# Altium schematic symbol library lib_datalogger.SchLib: 1246 symbols (part 11 of 16) (continued)
## CMP-018-000050-1
designator R?, comment RES 124K OHM 1% 1/8W 0805 SMD  Case/Package: 0805  Voltage Rating: 150V  Packaging: Tape and Reel  Max Operating Temperature: 155°C  Manufacturer: Vishay  Resistance: 124kR  Composition: Thick Film  Min Operating Temperature: -55°C  Package Quantity: 10  Tolerance: 1%
RESISTOR, 0805, 124K, 1%, SMD; Manufacturer Part Number: CRCW0805124KFKEA; Temperature Coefficient: 100ppm/°C; Power Rating: 125mW; Voltage Rating (DC): 150V; ComponentLink9Description: https://datasheet.ciiva.com/2496/dcrcwe3-2496174.pdf?src-supplier=Digi-Key; ComponentLink8URL: https://datasheet.ciiva.com/2496/dcrcwe3-2496173.pdf?src-supplier=Digi-Key; Width: 1.25mm; RoHS: Yes; ComponentLink7Description: https://datasheet.ciiva.com/2496/dcrcwe3-2496172.pdf?src-supplier=Digi-Key; Radiation Hardening: No; Source: mits.SchLib; ComponentLink4URL: https://datasheet.ciiva.com/3258/dcrcwe3-3258075.pdf?src-supplier=Avnet; Termination: SMD/SMT; ComponentLink5Description: https://datasheet.ciiva.com/5551/dcrcwe3-109170-5551131.pdf?src-supplier=Mouser; ComponentLink1Description: https://datasheet.ciiva.com/7714/1697337-7714262.pdf?src-supplier=Element14; Contact Plating: Tin; REACH SVHC: Unknown; Stock 1: 15950; ComponentLink8Description: https://datasheet.ciiva.com/2496/dcrcwe3-2496173.pdf?src-supplier=Digi-Key; Number of Pins: 2; Design Item ID: RES 124K OHM 1% 1/8W 0805 SMD; Features: Automotive AEC-Q200; Case Code (Metric): 2012; ComponentLink7URL: https://datasheet.ciiva.com/2496/dcrcwe3-2496172.pdf?src-supplier=Digi-Key; ComponentLink6Description: https://datasheet.ciiva.com/8974/dcrcwe3-8974027.pdf?src-supplier=Avnet; Depth: 1.25mm; ComponentLink2URL: https://datasheet.ciiva.com/7714/1697337-7714263.pdf?src-supplier=Element14; ComponentLink2Description: https://datasheet.ciiva.com/7714/1697337-7714263.pdf?src-supplier=Element14; Case Code (Imperial): 0805; Pricing 1: 1=0,10000, 10=0,06200, 100=0,02540, 1000=0,01142, 2500=0,00991 (USD); Lead Free: Lead Free; ComponentLink3URL: https://datasheet.ciiva.com/7725/125364-7725784.pdf?src-supplier=Element14; Height: 0.02inch; ComponentLink5URL: https://datasheet.ciiva.com/5551/dcrcwe3-109170-5551131.pdf?src-supplier=Mouser; ComponentLink4Description: https://datasheet.ciiva.com/3258/dcrcwe3-3258075.pdf?src-supplier=Avnet; Military Standard: Not; ComponentLink9URL: https://datasheet.ciiva.com/2496/dcrcwe3-2496174.pdf?src-supplier=Digi-Key; ComponentLink3Description: https://datasheet.ciiva.com/7725/125364-7725784.pdf?src-supplier=Element14; Weight: 0.000194oz; Number of Terminations: 2; Max Power Dissipation: 125mW; Length: 2mm; ComponentLink1URL: https://datasheet.ciiva.com/7714/1697337-7714262.pdf?src-supplier=Element14; ComponentLink6URL: https://datasheet.ciiva.com/8974/dcrcwe3-8974027.pdf?src-supplier=Avnet; Category: Chip SMD Resistors
footprint CR1608-0603 (Chip Resistor; Body 1.6 x 0.8 mm (LxW typ))
footprint CR2012-0805 (Chip Capacitor)
pins: 1, 2

## CMP-018-000051-1
designator R?, comment RES 12K4 OHM 1% 1/8W 0805 SMD  Packaging: Cut Tape (CT)  Composition: Thick Film  Tolerance: ±1%  Manufacturer: Panasonic Electronic Components
RES SMD 12.4K OHM 1% 1/8W 0805; Manufacturer Part Number: ERJ-6ENF1242V; Temperature Coefficient: ±100ppm/°C; Power (Watts): 0.125W, 1/8W; Resistance (Ohms): 12.4k; Package / Case: 0805 (2012 Metric); RoHS: RoHS Compliant; Supplier Device Package: 0805; Size / Dimension: 0.079" L x 0.049" W (2.00mm x 1.25mm); Design Item ID: RES 12K4 OHM 1% 1/8W 0805 SMD; Stock 1: 55334; Operating Temperature: -55°C ~ 155°C; Category: Resistors; Features: Automotive AEC-Q200; ComponentLink1Description: http://industrial.panasonic.com/www-cgi/jvcr13pz.cgi?E+PZ+3+AOA0002+ERJ6ENF1242V+7+WW; Pricing 1: 1=0.1, 50=0.022, 100=0.0162, 250=0.01236, 500=0.0099, 1000=0.00729 (USD); Source: mits.SchLib; Number of Terminations: 2; ComponentLink1URL: http://industrial.panasonic.com/www-cgi/jvcr13pz.cgi?E+PZ+3+AOA0002+ERJ6ENF1242V+7+WW; Height: 0.028" (0.70mm)
footprint CR1608-0603 (Chip Resistor; Body 1.6 x 0.8 mm (LxW typ))
footprint CR2012-0805 (Chip Capacitor)
pins: 1, 2

## CMP-018-000052-1
designator R?, comment RES 147K OHM 1% 1/8W 0805 SMD  Package Quantity: 5000  Case/Package: 0805  Tolerance: 1%  Manufacturer: Panasonic  Packaging: Tape and Reel  Min Operating Temperature: -55°C  Composition: Thick Film  Resistance: 147kR  Voltage Rating: 150V  Max Operating Temperature: 155°C
RES SMD 147K OHM 1% 1/8W 0805; Manufacturer Part Number: ERJ-6ENF1473V; Max Power Dissipation: 125mW; Temperature Coefficient: 100ppm/°C; Depth: 1.25mm; Length: 2mm; ComponentLink3Description: https://datasheet.ciiva.com/22673/1678782-22673805.pdf?src-supplier=Element14; Design Item ID: RES 147K OHM 1% 1/8W 0805 SMD; Contact Plating: Tin; Voltage Rating (DC): 150V; ComponentLink1Description: https://datasheet.ciiva.com/17207/aoa0000ce2-17207528.pdf?src-supplier=Avnet+Europe; REACH SVHC: Yes; Height: 0.028inch; Military Standard: Not; RoHS: Yes; Lead Free: Lead Free; Pricing 1: 1=0,10000, 10=0,07200, 100=0,02750, 1000=0,01210, 2500=0,01045 (USD); ComponentLink2URL: https://datasheet.ciiva.com/22741/1678782-22741001.pdf?src-supplier=Element14; ComponentLink4Description: https://datasheet.ciiva.com/9185/aoa0000ce2-9185646.pdf?src-supplier=Avnet; Weight: 0.000194oz; Case Code (Metric): 2012; Width: 0.049inch; ComponentLink3URL: https://datasheet.ciiva.com/22673/1678782-22673805.pdf?src-supplier=Element14; ComponentLink5Description: https://datasheet.ciiva.com/24124/aoa0000ce2-24124558.pdf?src-supplier=Mouser; Radiation Hardening: No; Category: Chip SMD Resistors; Number of Terminations: 2; Case Code (Imperial): 0805; Power Rating: 125mW; ComponentLink2Description: https://datasheet.ciiva.com/22741/1678782-22741001.pdf?src-supplier=Element14; ComponentLink1URL: https://datasheet.ciiva.com/17207/aoa0000ce2-17207528.pdf?src-supplier=Avnet+Europe; Mount: Surface Mount; ComponentLink4URL: https://datasheet.ciiva.com/9185/aoa0000ce2-9185646.pdf?src-supplier=Avnet; ComponentLink5URL: https://datasheet.ciiva.com/24124/aoa0000ce2-24124558.pdf?src-supplier=Mouser; Source: mits.SchLib; Stock 1: 5141; Termination: SMD/SMT
footprint CR1608-0603 (Chip Resistor; Body 1.6 x 0.8 mm (LxW typ))
footprint CR2012-0805 (Chip Capacitor)
pins: 1, 2

## CMP-018-000053-1
designator R?, comment RES 1K2 OHM 1% 1/10W 0603 SMD  Manufacturer: Yageo  Composition: Thick Film  Packaging: Cut Tape (CT)  Tolerance: ±1%
RES SMD 1.2K OHM 1% 1/10W 0603; Manufacturer Part Number: RC0603FR-071K2L; Temperature Coefficient: ±100ppm/°C; Power (Watts): 0.1W, 1/10W; Size / Dimension: 0.063" L x 0.031" W (1.60mm x 0.80mm); Resistance (Ohms): 1.2k; Part Status: Active; Number of Terminations: 2; Pricing 1: 1=0.1, 10=0.014, 25=0.01, 100=0.0057, 250=0.00436, 500=0.00348, 1000=0.00257, 2500=0.00223 (USD); ComponentLink1Description: http://www.yageo.com/NewPortal/yageodocoutput?fileName=/pdf/R-Chip/PYu-RC_Group_51_RoHS_L_4.pdf; Failure Rate: -; Supplier Device Package: 0603; Stock 1: 636414; Operating Temperature: -55°C ~ 155°C; RoHS: RoHS Compliant; Package / Case: 0603 (1608 Metric); Features: Moisture Resistant; Design Item ID: RES 1K2 OHM 1% 1/10W 0603 SMD; Category: Resistors; ComponentLink1URL: http://www.yageo.com/NewPortal/yageodocoutput?fileName=/pdf/R-Chip/PYu-RC_Group_51_RoHS_L_4.pdf; Height - Seated (Max): 0.022" (0.55mm); Source: mits.SchLib
footprint CR1608-0603 (Chip Resistor; Body 1.6 x 0.8 mm (LxW typ))
footprint CR1608-0603 (Chip Resistor; Body 1.6 x 0.8 mm (LxW typ))
pins: 1, 2

## CMP-018-000054-1
designator R?, comment RES 1K69 OHM 1/8W 1% 0805 SMD  Composition: Thick Film  Manufacturer: Panasonic Electronic Components  Tolerance: ±1%  Packaging: Cut Tape (CT)
RES SMD 1.69K OHM 1% 1/8W 0805; Manufacturer Part Number: ERJ-6ENF1691V; Temperature Coefficient: ±100ppm/°C; eVendorPrice: 0,10; eVendor: Digi-Key; eVendor#: P1.69KCCT-ND; Power (Watts): 0.125W, 1/8W; MSRP: 0,00675; Resistance (Ohms): 1.69k; Pricing 1: 1=0.1, 50=0.022, 100=0.0162, 250=0.01236, 500=0.0099, 1000=0.00729 (USD); ComponentLink1URL: http://industrial.panasonic.com/www-cgi/jvcr13pz.cgi?E+PZ+3+AOA0002+ERJ6ENF1691V+7+WW; Source: mits.SchLib; Datasheet: http://industrial.panasonic.com/www-cgi/jvcr13pz.cgi?E+PZ+3+AOA0002+ERJ6ENF1691V+7+WW; Supplier Device Package: 0805; Operating Temperature: -55°C ~ 155°C; Stock 1: 32872; Height: 0.028" (0.70mm); ComponentLink1Description: http://industrial.panasonic.com/www-cgi/jvcr13pz.cgi?E+PZ+3+AOA0002+ERJ6ENF1691V+7+WW; Features: Automotive AEC-Q200; Size / Dimension: 0.079" L x 0.049" W (2.00mm x 1.25mm); Design Item ID: RES 1K69 OHM 1/8W 1% 0805 SMD; MOQ: 2500; Part#: ERJ-6ENF1691V; Number of Terminations: 2; Package / Case: 0805 (2012 Metric); Category: Resistors; RoHS: RoHS Compliant
footprint CR1608-0603 (Chip Resistor; Body 1.6 x 0.8 mm (LxW typ))
footprint CR2012-0805 (Chip Capacitor)
pins: 1, 2

## CMP-018-000055-1
designator R?, comment RES 1M OHM 0.5% 1/4W 0805 SMD  Manufacturer: Panasonic
Thick Film Resistors - SMD AEC-Q200; Manufacturer Part Number: ERJ-UP3D1004V; ComponentLink1URL: https://br.mouser.com/datasheet/2/315/Panasonic_Resistors_Thick_Film_Anti_Sulf_Anti_Surg-1825099.pdf; Design Item ID: RES 1M OHM 0.5% 1/4W 0805 SMD; Pricing 1: 1=0,48100, 25=0,40600, 50=0,28300, 100=0,15900, 250=0,13600, 500=0,11500 (USD); Source: mits.SchLib; Stock 1: 8579; RoHS: No; Category: Chip SMD Resistors; ComponentLink1Description: Datasheet
footprint CR1608-0603 (Chip Resistor; Body 1.6 x 0.8 mm (LxW typ))
footprint CR2012-0805 (Chip Capacitor)
pins: 1, 2

## CMP-018-000056-1
designator R?, comment RES 21K OHM 1/10W 1% 0603 SMD  Max Operating Temperature: 155°C  Packaging: Tape and Reel  Tolerance: 1%  Min Operating Temperature: -55°C  Manufacturer: Bourns  Resistance: 21kR  Package Quantity: 5000  Case/Package: 0603  Voltage Rating: 50V
21K Ohm 1% 0.1W(1/10W)  SMD; Manufacturer Part Number: CR0603-FX-2102ELF; Power Rating: 100mW; Temperature Coefficient: 100ppm/°C; ComponentLink2Description: https://datasheet.ciiva.com/14986/chpreztr-14986591.pdf?src-supplier=Digi-Key; ComponentLink2URL: https://datasheet.ciiva.com/14986/chpreztr-14986591.pdf?src-supplier=Digi-Key; Stock 1: 23550; Contact Plating: Tin; ComponentLink1Description: https://datasheet.ciiva.com/9121/chpreztr-9121901.pdf?src-supplier=Avnet; Number of Terminations: 2; Mount: Surface Mount; Design Item ID: RES 21K OHM 1/10W 1% 0603 SMD; ComponentLink1URL: https://datasheet.ciiva.com/9121/chpreztr-9121901.pdf?src-supplier=Avnet; Category: Chip SMD Resistors; Case Code (Metric): 1608; Resistor Type: Thick Film; Length: 1.6mm; RoHS: Yes; Series: CR0603; Max Power Dissipation: 100mW; Features: Moisture Resistant; Pricing 1: 50=0,00770, 500=0,00600, 1500=0,00580, 5000=0,00540, 25000=0,00520, 50000=0,00520, 50=0,00740, 500=0,00580, 1500=0,00550, 5000=0,00520, 25000=0,00500, 50000=0,00500, 50=0,03860, 500=0,03010, 1500=0,02880, 5000=0,02680, 25000=0,02620, 50000=0,02620, 50=0,03720, 500=0,02900, 1500=0,02770, 5000=0,02590, 25000=0,02520, 50000=0,02520, 50=0,00500, 500=0,00390, 1500=0,00370, 5000=0,00350, 25000=0,00340, 50000=0,00340, 50=0,00430, 500=0,00330, 1500=0,00320, 5000=0,00300, 25000=0,00290, 50000=0,00290, 50=0,04580, 500=0,03570, 1500=0,03420, 5000=0,03190, 25000=0,03110, 50000=0,03110, 50=0,64670, 500=0,50420, 1500=0,48230, 5000=0,44940, 25000=0,43850, 50000=0,43850, 50=0,02450, 500=0,01910, 1500=0,01820, 5000=0,01700, 25000=0,01660, 50000=0,01660, 50=0,44850, 500=0,34970, 1500=0,33450, 5000=0,31170, 25000=0,30410, 50000=0,30410, 50=0,05100, 500=0,03970, 1500=0,03800, 5000=0,03540, 25000=0,03460, 50000=0,03460, 50=0,00790, 500=0,00620, 1500=0,00590, 5000=0,00550, 25000=0,00540, 50000=0,00540, 50=0,00590, 500=0,00460, 1500=0,00440, 5000=0,00410, 25000=0,00400, 50000=0,00400 (AUD); Source: mits.SchLib; Termination: SMD/SMT; Width: 0.8mm; ComponentLink3Description: https://datasheet.ciiva.com/5586/chpreztr-5586573.pdf?src-supplier=Mouser; Case Code (Imperial): 0603; Radiation Hardening: No; Depth: 0.8mm; Military Standard: Not; Thickness: 457um; ComponentLink3URL: https://datasheet.ciiva.com/5586/chpreztr-5586573.pdf?src-supplier=Mouser; Construction: Rectangular; Height: 0.022inch
footprint CR1608-0603 (Chip Resistor; Body 1.6 x 0.8 mm (LxW typ))
footprint CR1608-0603 (Chip Resistor; Body 1.6 x 0.8 mm (LxW typ))
pins: 1, 2

## CMP-018-000057-1
designator R?, comment RES 220R OHM 5% 1/8W 0805 SMD  Packaging: Cut Tape (CT)  Composition: Thick Film  Manufacturer: Panasonic Electronic Components  Tolerance: ±5%
RES SMD 220 OHM 5% 1/8W 0805; Manufacturer Part Number: ERJ-6GEYJ221V; Resistance (Ohms): 220; Temperature Coefficient: ±200ppm/°C; Power (Watts): 0.125W, 1/8W; Manufacturer Part Number 2: 0805W8F2200T5E; Pricing 1: 1=0.1, 10=0.025, 25=0.018, 50=0.0136, 100=0.01, 250=0.00764, 500=0.00612, 1000=0.00451 (USD); Size / Dimension: 0.079" L x 0.049" W (2.00mm x 1.25mm); Pricing 2: 0.0034; ComponentLink1Description: http://industrial.panasonic.com/www-cgi/jvcr13pz.cgi?E+PZ+3+AOA0001+ERJ6GEYJ221V+7+WW; Category: Resistors; ComponentLink1URL: http://industrial.panasonic.com/www-cgi/jvcr13pz.cgi?E+PZ+3+AOA0001+ERJ6GEYJ221V+7+WW; Design Item ID: RES 220R OHM 5% 1/8W 0805 SMD; Failure Rate: -; Manufacturer 2: UNI-ROYAL(Uniroyal Elec); Source: mits.SchLib; RoHS: RoHS Compliant; Features: Automotive AEC-Q200; Part Status: Active; Supplier Device Package: 0805; Height - Seated (Max): 0.028" (0.70mm); Operating Temperature: -55°C ~ 155°C; Stock 1: 118007; Package / Case: 0805 (2012 Metric)
footprint CR1608-0603 (Chip Resistor; Body 1.6 x 0.8 mm (LxW typ))
footprint CR2012-0805 (Chip Capacitor)
pins: 1, 2

## CMP-018-000058-1
designator R?, comment RES 22K OHM 1% 1/10W 0603 SMD  Packaging: Cut Tape (CT)  Manufacturer: Yageo  Composition: Thick Film  Tolerance: ±1%
RES SMD 22K OHM 1% 1/10W 0603; Manufacturer Part Number: RC0603FR-0722KL; Power (Watts): 0.1W, 1/10W; Temperature Coefficient: ±100ppm/°C; ComponentLink1URL: http://www.yageo.com/documents/recent/PYu-RC_Group_51_RoHS_L_7.pdf; ComponentLink1Description: http://www.yageo.com/documents/recent/PYu-RC_Group_51_RoHS_L_7.pdf; Design Item ID: RES 22K OHM 1% 1/10W 0603 SMD; Part Status: Active; Failure Rate: -; Operating Temperature: -55°C ~ 155°C; Features: Moisture Resistant; Package / Case: 0603 (1608 Metric); Height - Seated (Max): 0.022" (0.55mm); Resistance (Ohms): 22k; Pricing 1: 1=0.1, 10=0.013, 25=0.0092, 50=0.007, 100=0.0052, 250=0.00396, 500=0.00316, 1000=0.00233 (USD); Category: Resistors; Size / Dimension: 0.063" L x 0.031" W (1.60mm x 0.80mm); Stock 1: 1971619; Supplier Device Package: 0603; Source: mits.SchLib; RoHS: RoHS Compliant
footprint CR1608-0603 (Chip Resistor; Body 1.6 x 0.8 mm (LxW typ))
footprint CR1608-0603 (Chip Resistor; Body 1.6 x 0.8 mm (LxW typ))
pins: 1, 2

## CMP-018-000059-1
designator R?, comment RES 249K OHM 1% 1/8W 0805 SMD  Package Quantity: 1  Resistance: 249kR  Tolerance: 0.1%  Manufacturer: Panasonic  Voltage Rating: 100V  Min Operating Temperature: -55°C  Composition: Thin Film,Metal Film  Packaging: Tape and Reel  Case/Package: 0805  Max Operating Temperature: 155°C
PANASONIC - ERA6AEB2493V - SMD Chip Resistor, 0805 [2012 Metric], 249 kohm, ERA6A Series, 100 V, Thin Film, 125 mW; Max Power Dissipation: 125mW; Temperature Coefficient: 25ppm/°C; ComponentLink8Description: https://datasheet.ciiva.com/6052/485442-6052761.pdf?src-supplier=Farnell; ComponentLink6Description: https://datasheet.ciiva.com/6052/485442-6052765.pdf?src-supplier=Farnell; Number of Terminations: 2; ComponentLink1URL: https://datasheet.ciiva.com/11810/0900766b80eb1d8c-11810601.pdf?src-supplier=RSComponents; Lead Free: Lead Free; Pricing 1: 1=0,34000, 10=0,28800, 100=0,11260, 1000=0,04712, 2500=0,04320 (USD); ComponentLink4URL: https://datasheet.ciiva.com/22707/485442-22707848.pdf?src-supplier=Element14; Design Item ID: RES 249K OHM 1% 1/8W 0805 SMD; ComponentLink7URL: https://datasheet.ciiva.com/17206/aoa0000ce26-17206669.pdf?src-supplier=Avnet+Europe; Mount: Surface Mount; Features: Automotive AEC-Q200; Height: 0.5mm; Number of Pins: 2; Case Code (Imperial): 0805; Power Rating: 125mW; ComponentLink1Description: https://datasheet.ciiva.com/11810/0900766b80eb1d8c-11810601.pdf?src-supplier=RSComponents; Category: Chip SMD Resistors; ComponentLink8URL: https://datasheet.ciiva.com/6052/485442-6052761.pdf?src-supplier=Farnell; Manufacturer Part Number: ERA6AEB2493V; Voltage Rating (DC): 100V; ComponentLink5Description: https://datasheet.ciiva.com/6052/485442-6052763.pdf?src-supplier=Farnell; ComponentLink9URL: https://datasheet.ciiva.com/24159/aoa0000ce26-197354-24159929.pdf?src-supplier=Mouser; Depth: 1.25mm; ComponentLink3Description: https://datasheet.ciiva.com/9183/aoa0000ce26-9183896.pdf?src-supplier=Avnet; Termination: SMD/SMT; ComponentLink4Description: https://datasheet.ciiva.com/22707/485442-22707848.pdf?src-supplier=Element14; ComponentLink2URL: https://datasheet.ciiva.com/41450/001181379-da-01-en-widerstand-era-0805-249k-0-1-5000st-41450537.pdf?src-supplier=Conrad; Stock 1: 34760; Military Standard: Not; ComponentLink3URL: https://datasheet.ciiva.com/9183/aoa0000ce26-9183896.pdf?src-supplier=Avnet; ComponentLink2Description: https://datasheet.ciiva.com/41450/001181379-da-01-en-widerstand-era-0805-249k-0-1-5000st-41450537.pdf?src-supplier=Conrad; Width: 1.25mm; Length: 2mm; RoHS: Yes; Weight: 0.000194oz; REACH SVHC: No SVHC; Case Code (Metric): 2012; ComponentLink6URL: https://datasheet.ciiva.com/6052/485442-6052765.pdf?src-supplier=Farnell; ComponentLink9Description: https://datasheet.ciiva.com/24159/aoa0000ce26-197354-24159929.pdf?src-supplier=Mouser; Source: mits.SchLib; ComponentLink7Description: https://datasheet.ciiva.com/17206/aoa0000ce26-17206669.pdf?src-supplier=Avnet+Europe; Radiation Hardening: No; ComponentLink5URL: https://datasheet.ciiva.com/6052/485442-6052763.pdf?src-supplier=Farnell; Contact Plating: Tin
footprint CR1608-0603 (Chip Resistor; Body 1.6 x 0.8 mm (LxW typ))
footprint CR2012-0805 (Chip Capacitor)
pins: 1, 2

## CMP-018-000060-1
designator R?, comment RES 261K OHM 1% 1/8W 0805 SMD  Manufacturer: Yageo  Resistance: 261kR  Packaging: Tape and Reel  Min Operating Temperature: -55°C  Case/Package: 0805  Max Operating Temperature: 155°C  Voltage Rating: 150V  Composition: Thick Film  Tolerance: 1%
RES SMD 261K OHM 1% 1/8W 0805; Manufacturer Part Number: RC0805FR-07261KL; Temperature Coefficient: 100ppm/°C; Power Rating: 125mW; ComponentLink2URL: https://datasheet.ciiva.com/17484/rc0805-17484039.pdf?src-supplier=Future+Electronics; Lead Free: Lead Free; Design Item ID: RES 261K OHM 1% 1/8W 0805 SMD; ComponentLink1URL: http://rohmfs.rohm.com/en/products/databook/datasheet/passive/resistor/chip_resistor/mcr_g.pdf; Stock 1: 116024; Military Standard: Not; Length: 2mm; Pricing 1: 1=0,10000, 10=0,04000, 100=0,01630, 1000=0,00731, 2500=0,00635 (USD); Width: 1.25mm; Voltage Rating (DC): 150V; Depth: 1.25mm; Termination: SMD/SMT; Case Code (Imperial): 0805; ComponentLink2Description: https://datasheet.ciiva.com/17484/rc0805-17484039.pdf?src-supplier=Future+Electronics; ComponentLink1Description: http://rohmfs.rohm.com/en/products/databook/datasheet/passive/resistor/chip_resistor/mcr_g.pdf; Height: 0.5mm; RoHS: Yes; Source: mits.SchLib; Category: Chip SMD Resistors; Case Code (Metric): 2012
footprint CR1608-0603 (Chip Resistor; Body 1.6 x 0.8 mm (LxW typ))
footprint CR2012-0805 (Chip Capacitor)
pins: 1, 2

## CMP-018-000061-1
designator R?, comment RES 2k2 OHM 1% 1/10W 0402 SMD  Manufacturer: Panasonic Electronic Components
RES SMD 2.2K OHM 1% 1/10W 0402; Part#: ERJ-2RKF2201X; eVendor: Digi-Key; eVendor#: P2.20KLCT-ND; eVendorPrice: 0,10; MSRP: 0,00383; Design Item ID: RES 2k2 OHM 1% 1/10W 0402 SMD; Datasheet: http://industrial.panasonic.com/www-cgi/jvcr13pz.cgi?E+PZ+3+AOA0002+ERJ2RKF2201X+7+WW; Source: mits.SchLib; Obs: --; MOQ: 5000
footprint CR1608-0603 (Chip Resistor; Body 1.6 x 0.8 mm (LxW typ))
footprint CR1005-0402
pins: 1, 2

## CMP-018-000062-1
designator R?, comment RES 316K OHM 1% 1/8W 0805 SMD  Manufacturer: Panasonic Electronic Components  Composition: Thick Film  Packaging: Cut Tape (CT)  Tolerance: ±1%
RES SMD 316K OHM 1% 1/8W 0805; Manufacturer Part Number: ERJ-6ENF3163V; Temperature Coefficient: ±100ppm/°C; Power (Watts): 0.125W, 1/8W; Resistance (Ohms): 316k; RoHS: RoHS Compliant; Package / Case: 0805 (2012 Metric); Category: Resistors; Supplier Device Package: 0805; Features: Automotive AEC-Q200; Source: mits.SchLib; ComponentLink1URL: http://industrial.panasonic.com/www-cgi/jvcr13pz.cgi?E+PZ+3+AOA0002+ERJ6ENF3163V+7+WW; Pricing 1: 1=0.1, 50=0.022, 100=0.0162, 250=0.01236, 500=0.0099, 1000=0.00729 (USD); Number of Terminations: 2; Operating Temperature: -55°C ~ 155°C; Stock 1: 97409; Design Item ID: RES 316K OHM 1% 1/8W 0805 SMD; Height: 0.028" (0.70mm); ComponentLink1Description: http://industrial.panasonic.com/www-cgi/jvcr13pz.cgi?E+PZ+3+AOA0002+ERJ6ENF3163V+7+WW; Size / Dimension: 0.079" L x 0.049" W (2.00mm x 1.25mm)
footprint CR1608-0603 (Chip Resistor; Body 1.6 x 0.8 mm (LxW typ))
footprint CR2012-0805 (Chip Capacitor)
pins: 1, 2

## CMP-018-000063-1
designator R?, comment RES 33K OHM 1% 1/10W 0603 SMD  Tolerance: ±1%  Composition: Thick Film  Manufacturer: Yageo  Packaging: Cut Tape (CT)
RES SMD 33K OHM 1% 1/10W 0603; Manufacturer Part Number: RC0603FR-0733KL; Temperature Coefficient: ±100ppm/°C; Power (Watts): 0.1W, 1/10W; Category: Resistors; Source: mits.SchLib; Pricing 1: 1=0.1, 10=0.013, 25=0.0092, 50=0.007, 100=0.0052, 250=0.00396, 500=0.00316, 1000=0.00233 (USD); RoHS: RoHS Compliant; Design Item ID: RES 33K OHM 1% 1/10W 0603 SMD; ComponentLink1URL: http://www.yageo.com/documents/recent/PYu-RC_Group_51_RoHS_L_7.pdf; Resistance (Ohms): 33k; Size / Dimension: 0.063" L x 0.031" W (1.60mm x 0.80mm); Features: Moisture Resistant; Height - Seated (Max): 0.022" (0.55mm); Stock 1: 611289; Failure Rate: -; Supplier Device Package: 0603; Part Status: Active; Package / Case: 0603 (1608 Metric); ComponentLink1Description: http://www.yageo.com/documents/recent/PYu-RC_Group_51_RoHS_L_7.pdf; Operating Temperature: -55°C ~ 155°C
footprint CR1608-0603 (Chip Resistor; Body 1.6 x 0.8 mm (LxW typ))
footprint CR1608-0603 (Chip Resistor; Body 1.6 x 0.8 mm (LxW typ))
pins: 1, 2

## CMP-018-000064-1
designator R?, comment RES 36K5 OHM 1% 1/8W 0805 SMD  Packaging: Cut Tape (CT)  Manufacturer: Uniroyal  Tolerance: ±1%  Composition: Thick Film
RES SMD 36.5K OHM 1% 1/8W 0805; Temperature Coefficient: ±100ppm/°C; Power (Watts): 0.125W, 1/8W; ComponentLink1Description: http://industrial.panasonic.com/www-cgi/jvcr13pz.cgi?E+PZ+3+AOA0002+ERJ6ENF3652V+7+WW; Number of Terminations: 2; Size / Dimension: 0.079" L x 0.049" W (2.00mm x 1.25mm); RoHS: RoHS Compliant; Package / Case: 0805 (2012 Metric); Design Item ID: RES 36K5 OHM 1% 1/8W 0805 SMD; Part Status: Active; Source: mits.SchLib; Stock 1: 32154; ComponentLink1URL: http://industrial.panasonic.com/www-cgi/jvcr13pz.cgi?E+PZ+3+AOA0002+ERJ6ENF3652V+7+WW; Supplier Device Package: 0805; Features: Automotive AEC-Q200; Operating Temperature: -55°C ~ 155°C; Category: Resistors; Resistance (Ohms): 36.5k; Pricing 1: 1=0.1, 50=0.022, 100=0.0162, 250=0.01236, 500=0.0099, 1000=0.00729 (USD); Height: 0.028" (0.70mm)
footprint CR1608-0603 (Chip Resistor; Body 1.6 x 0.8 mm (LxW typ))
footprint CR2012-0805 (Chip Capacitor)
pins: 1, 2

## CMP-018-000065-1
designator R?, comment RES 39K OHM 1% 1/10W 0603 SMD  Packaging: Cut Tape (CT)  Manufacturer: Yageo  Composition: Thick Film  Tolerance: ±1%
RES SMD 39K OHM 1% 1/10W 0603; Manufacturer Part Number: RC0603FR-0739KL; Power (Watts): 0.1W, 1/10W; Temperature Coefficient: ±100ppm/°C; Features: Moisture Resistant; ComponentLink1URL: http://www.yageo.com/NewPortal/yageodocoutput?fileName=/pdf/R-Chip/PYu-RC_Group_51_RoHS_L_4.pdf; Operating Temperature: -55°C ~ 155°C; Stock 1: 299505; Category: Resistors; ComponentLink1Description: http://www.yageo.com/NewPortal/yageodocoutput?fileName=/pdf/R-Chip/PYu-RC_Group_51_RoHS_L_4.pdf; Source: mits.SchLib; RoHS: RoHS Compliant; Height - Seated (Max): 0.022" (0.55mm); Resistance (Ohms): 39k; Package / Case: 0603 (1608 Metric); Size / Dimension: 0.063" L x 0.031" W (1.60mm x 0.80mm); Pricing 1: 1=0.1, 10=0.014, 25=0.01, 100=0.0057, 250=0.00436, 500=0.00348, 1000=0.00257, 2500=0.00223 (USD); Supplier Device Package: 0603; Failure Rate: -; Part Status: Active; Number of Terminations: 2; Design Item ID: RES 39K OHM 1% 1/10W 0603 SMD
footprint CR1608-0603 (Chip Resistor; Body 1.6 x 0.8 mm (LxW typ))
footprint CR1608-0603 (Chip Resistor; Body 1.6 x 0.8 mm (LxW typ))
pins: 1, 2

## CMP-018-000066-1
designator R?, comment RES 39R OHM 1% 1/10W 0603 SMD  Packaging: Cut Tape (CT)  Composition: Thick Film  Manufacturer: Yageo  Tolerance: ±1%
RES SMD 39 OHM 1% 1/10W 0603; Manufacturer Part Number: RC0603FR-0739RL; Resistance (Ohms): 39; Temperature Coefficient: ±100ppm/°C; Power (Watts): 0.1W, 1/10W; Design Item ID: RES 39R OHM 1% 1/10W 0603 SMD; Height - Seated (Max): 0.022" (0.55mm); Source: mits.SchLib; Failure Rate: -; Size / Dimension: 0.063" L x 0.031" W (1.60mm x 0.80mm); Package / Case: 0603 (1608 Metric); RoHS: RoHS Compliant; ComponentLink1URL: http://www.yageo.com/documents/recent/PYu-RC_Group_51_RoHS_L_6.pdf; Category: Resistors; Pricing 1: 1=0.1, 10=0.013, 25=0.0092, 50=0.007, 100=0.0052, 250=0.00396, 500=0.00316, 1000=0.00233 (USD); Stock 1: 198722; Supplier Device Package: 0603; Part Status: Active; ComponentLink1Description: http://www.yageo.com/documents/recent/PYu-RC_Group_51_RoHS_L_6.pdf; Operating Temperature: -55°C ~ 155°C; Features: Moisture Resistant
footprint CR1608-0603 (Chip Resistor; Body 1.6 x 0.8 mm (LxW typ))
footprint CR1608-0603 (Chip Resistor; Body 1.6 x 0.8 mm (LxW typ))
pins: 1, 2

## CMP-018-000067-2
designator R?, comment RC0603JR-073K9L  Max Operating Temperature: 155°C  Tolerance: 5%  Packaging: Tape and Reel  Manufacturer: Yageo  Resistance: 3.9kR  Case/Package: 0603  RoHS Compliant: Yes  Voltage Rating: 50V  Package Quantity: 1  Min Operating Temperature: -55°C
Res Thick Film 0603 3.9K Ohm 5% 1/10W ±100ppm/°C Molded SMD SMD Paper T/R; eVendor#: 311-3.9KGRCT-ND; eVendor: Digi-Key; MSRP: 0,00172; Power Rating: 100mW; eVendorPrice: 0,10; Construction: Rectangular; Height: 0.022inch; Datasheet: http://www.yageo.com/NewPortal/yageodocoutput?fileName=/pdf/R-Chip/PYu-RC_Group_51_RoHS_L_3.pdf; Lead Free: Lead Free; Depth: 0.8mm; Series: RC; Termination: SMD/SMT; Length: 0.063inch; Size Code: 0603; Temperature Coefficient: 100ppm/°C; Military Standard: Not; Radiation Hardening: No; Contact Plating: Tin,Matte; Number of Terminations: 2; Features: Moisture Resistant; Width: 0.031inch; Case Code (Metric): 1608; Resistor Type: Thick Film; Design Item ID: RES 3K9 OHM 5% 1/10W 0603 SMD; Number of Pins: 2; Source: mits.SchLib; Voltage Rating (DC): 50V; Max Power Dissipation: 100mW; Case Code (Imperial): 0603; MOQ: 2500; Part#: RC0603JR-073K9L; REACH SVHC: No SVHC; Resistance Tolerance: 5%
footprint CR1608-0603 (Chip Resistor; Body 1.6 x 0.8 mm (LxW typ))
footprint CR1608-0603 (Chip Resistor; Body 1.6 x 0.8 mm (LxW typ))
pins: 1, 2

## CMP-018-000068-1
designator R?, comment RES 41K2 OHM 1% 1/8W 0805 SMD  Composition: Thick Film  Manufacturer: Panasonic Electronic Components  Tolerance: ±1%  Packaging: Cut Tape (CT)
RES SMD 41.2K OHM 1% 1/8W 0805; Manufacturer Part Number: ERJ-6ENF4122V; Power (Watts): 0.125W, 1/8W; Temperature Coefficient: ±100ppm/°C; Package / Case: 0805 (2012 Metric); Part Status: Active; ComponentLink1URL: https://industrial.panasonic.com/cdbs/www-data/pdf/RDA0000/AOA0000C283.pdf; Number of Terminations: 2; Category: Resistors; Supplier Device Package: 0805; Size / Dimension: 0.079" L x 0.049" W (2.00mm x 1.25mm); Resistance (Ohms): 41.2k; Operating Temperature: -55°C ~ 155°C; Pricing 1: 1=0.1, 10=0.036, 25=0.0264, 50=0.02, 100=0.0148, 250=0.01124, 500=0.009, 1000=0.00663 (USD); RoHS: RoHS Compliant; Features: Automotive AEC-Q200; Height - Seated (Max): 0.028" (0.70mm); Source: mits.SchLib; Stock 1: 30666; Failure Rate: -; ComponentLink1Description: https://industrial.panasonic.com/cdbs/www-data/pdf/RDA0000/AOA0000C283.pdf; Design Item ID: RES 41K2 OHM 1% 1/8W 0805 SMD
footprint CR1608-0603 (Chip Resistor; Body 1.6 x 0.8 mm (LxW typ))
footprint CR2012-0805 (Chip Capacitor)
pins: 1, 2

## CMP-018-000069-1
designator R?, comment RES 432K OHM 1% 1/8W 0805 SMD  Packaging: Cut Tape (CT)  Manufacturer: Panasonic Electronic Components  Tolerance: ±1%  Composition: Thick Film
RES SMD 432K OHM 1% 1/8W 0805; Manufacturer Part Number: ERJ-6ENF4323V; Temperature Coefficient: ±100ppm/°C; Power (Watts): 0.125W, 1/8W; ComponentLink1URL: http://industrial.panasonic.com/www-cgi/jvcr13pz.cgi?E+PZ+3+AOA0002+ERJ6ENF4323V+7+WW; Size / Dimension: 0.079" L x 0.049" W (2.00mm x 1.25mm); Pricing 1: 1=0.1, 50=0.022, 100=0.0162, 250=0.01236, 500=0.0099, 1000=0.00729 (USD); Number of Terminations: 2; ComponentLink1Description: http://industrial.panasonic.com/www-cgi/jvcr13pz.cgi?E+PZ+3+AOA0002+ERJ6ENF4323V+7+WW; Part Status: Active; Category: Resistors; RoHS: RoHS Compliant; Design Item ID: RES 432K OHM 1% 1/8W 0805 SMD; Features: Automotive AEC-Q200; Resistance (Ohms): 432k; Supplier Device Package: 0805; Height: 0.028" (0.70mm); Package / Case: 0805 (2012 Metric); Stock 1: 41728; Source: mits.SchLib; Operating Temperature: -55°C ~ 155°C
footprint CR1608-0603 (Chip Resistor; Body 1.6 x 0.8 mm (LxW typ))
footprint CR2012-0805 (Chip Capacitor)
pins: 1, 2

## CMP-018-000070-1
designator R?, comment RES 470K OHM 1% 1/8W 0603 SMD  Case/Package: 0805  Voltage Rating: 100V  Tolerance: 0.1%  Composition: Thin Film,Metal Film  Min Operating Temperature: -55°C  Resistance: 470kR  Max Operating Temperature: 155°C  Packaging: Tape and Reel  Manufacturer: Panasonic  Package Quantity: 1
RES, THICK FILM, 470KOHM, 0.1W, 0603; Manufacturer Part Number: ERA-6AEB474V; Temperature Coefficient: 25ppm/°C; Power Rating: 125mW; Pricing 1: 1=0,36000, 10=0,30200, 100=0,11820, 1000=0,04948, 2500=0,04536 (USD); ComponentLink11URL: https://datasheet.ciiva.com/17205/aoa0000ce2-17205660.pdf?src-supplier=Avnet+Europe; ComponentLink8Description: https://datasheet.ciiva.com/17205/aoa0000ce26-17205647.pdf?src-supplier=Avnet+Europe; ComponentLink1URL: http://www.yageo.com/documents/recent/PYu-RC_Group_51_RoHS_L_7.pdf; ComponentLink6URL: https://datasheet.ciiva.com/46444/485442-46444805.pdf?src-supplier=Element14; Source: mits.SchLib; Features: Automotive AEC-Q200; ComponentLink2URL: https://datasheet.ciiva.com/9189/aoa0000ce26-9189398.pdf?src-supplier=Avnet; RoHS: Yes; ComponentLink5URL: https://datasheet.ciiva.com/5875/485442-5875541.pdf?src-supplier=Farnell; Length: 2mm; Lead Free: Lead Free; ComponentLink7URL: https://datasheet.ciiva.com/30177/54aoa0000ce26-30177306.pdf?src-supplier=Onlinecomponents.com; Depth: 1.25mm; ComponentLink5Description: https://datasheet.ciiva.com/5875/485442-5875541.pdf?src-supplier=Farnell; Mount: Surface Mount; ComponentLink3URL: https://datasheet.ciiva.com/11808/0900766b80eb1d8c-11808090.pdf?src-supplier=RSComponents; Voltage Rating (DC): 100V; Case Code (Imperial): 0805; ComponentLink14Description: https://datasheet.ciiva.com/9117/aoa0000ce2-9117093.pdf?src-supplier=Avnet; Design Item ID: RES 470K OHM 1% 1/8W 0603 SMD; ComponentLink15Description: https://datasheet.ciiva.com/16514/aoa0000ce2-16514074.pdf?src-supplier=Avnet+Asia; Pricing 2: 1=0,10000, 10=0,04900, 100=0,01980, 1000=0,00890, 2500=0,00773 (USD); ComponentLink17Description: https://datasheet.ciiva.com/22687/1678782-22687437.pdf?src-supplier=Element14; ComponentLink16Description: https://datasheet.ciiva.com/16786/70260748-16786907.pdf?src-supplier=Allied+Electronics; ComponentLink12Description: https://datasheet.ciiva.com/9181/aoa0000ce2-9181725.pdf?src-supplier=Avnet; ComponentLink12URL: https://datasheet.ciiva.com/9181/aoa0000ce2-9181725.pdf?src-supplier=Avnet; Case Code (Metric): 2012; ComponentLink18URL: https://datasheet.ciiva.com/46444/1678782-46444813.pdf?src-supplier=Element14; ComponentLink19Description: https://datasheet.ciiva.com/46444/1678782-46444814.pdf?src-supplier=Element14; Height: 0.5mm; REACH SVHC: No SVHC; ComponentLink6Description: https://datasheet.ciiva.com/46444/485442-46444805.pdf?src-supplier=Element14; Military Standard: Not; Number of Terminations: 2; ComponentLink16URL: https://datasheet.ciiva.com/16786/70260748-16786907.pdf?src-supplier=Allied+Electronics; ComponentLink18Description: https://datasheet.ciiva.com/46444/1678782-46444813.pdf?src-supplier=Element14; Termination: SMD/SMT; ComponentLink11Description: https://datasheet.ciiva.com/17205/aoa0000ce2-17205660.pdf?src-supplier=Avnet+Europe; ComponentLink15URL: https://datasheet.ciiva.com/16514/aoa0000ce2-16514074.pdf?src-supplier=Avnet+Asia; ComponentLink19URL: https://datasheet.ciiva.com/46444/1678782-46444814.pdf?src-supplier=Element14; Width: 1.25mm; Stock 1: 32083; ComponentLink1Description: http://www.yageo.com/documents/recent/PYu-RC_Group_51_RoHS_L_7.pdf; ComponentLink13Description: https://datasheet.ciiva.com/16759/70260748-16759934.pdf?src-supplier=Allied+Electronics; ComponentLink14URL: https://datasheet.ciiva.com/9117/aoa0000ce2-9117093.pdf?src-supplier=Avnet; Stock 2: 147809; Number of Pins: 2; ComponentLink7Description: https://datasheet.ciiva.com/30177/54aoa0000ce26-30177306.pdf?src-supplier=Onlinecomponents.com; ComponentLink17URL: https://datasheet.ciiva.com/22687/1678782-22687437.pdf?src-supplier=Element14; ComponentLink8URL: https://datasheet.ciiva.com/17205/aoa0000ce26-17205647.pdf?src-supplier=Avnet+Europe; Category: Chip SMD Resistors; ComponentLink10URL: https://datasheet.ciiva.com/7836/aoa0000ce2-7836505.pdf?src-supplier=Element14; ComponentLink3Description: https://datasheet.ciiva.com/11808/0900766b80eb1d8c-11808090.pdf?src-supplier=RSComponents; ComponentLink9Description: https://datasheet.ciiva.com/28676/485442-28676607.pdf?src-supplier=Element14; Contact Plating: Tin; ComponentLink13URL: https://datasheet.ciiva.com/16759/70260748-16759934.pdf?src-supplier=Allied+Electronics; ComponentLink4Description: https://datasheet.ciiva.com/26335/458319-da-01-en-widerstand-0805-era-26335741.pdf?src-supplier=Conrad; Radiation Hardening: No; Max Power Dissipation: 125mW; ComponentLink4URL: https://datasheet.ciiva.com/26335/458319-da-01-en-widerstand-0805-era-26335741.pdf?src-supplier=Conrad; ComponentLink9URL: https://datasheet.ciiva.com/28676/485442-28676607.pdf?src-supplier=Element14; ComponentLink10Description: https://datasheet.ciiva.com/7836/aoa0000ce2-7836505.pdf?src-supplier=Element14; ComponentLink2Description: https://datasheet.ciiva.com/9189/aoa0000ce26-9189398.pdf?src-supplier=Avnet
footprint CR1608-0603 (Chip Resistor; Body 1.6 x 0.8 mm (LxW typ))
footprint CC1608-0603 (Chip Capacitor; Body 1.6 x 0.8 mm (LxW typ))
pins: 1, 2